# Altium footprint library LED.PcbLib: 71 footprints (part 3 of 5)
Each footprint in its own frame and in the unit in brackets; x right, y up, seen from the top. Pads: shape width x height; smd on the part's side, far side on the other; paste and mask are expansions set on the pad; w line width, h text height; cw(c..) or ccw(c..) is an arc to the next point about the centre after c.
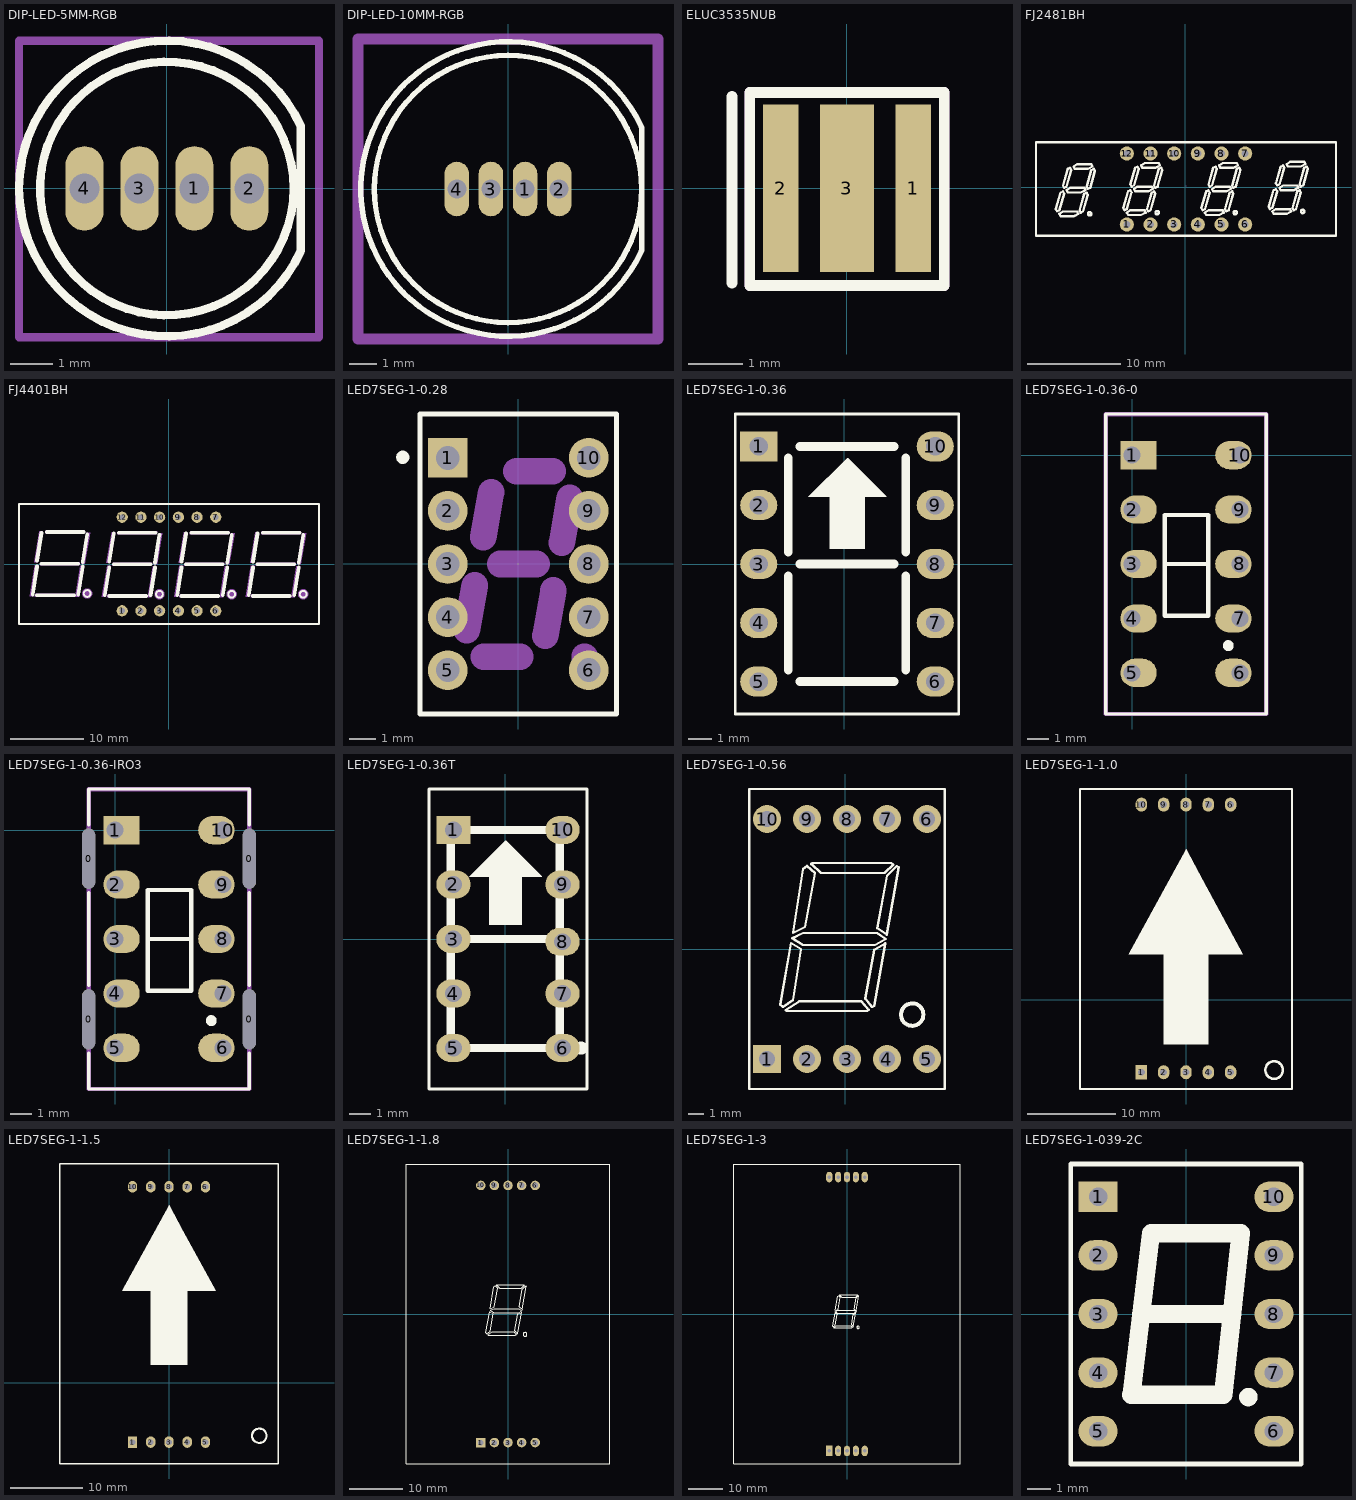
[diagram p2: the footprints below, top view; thin cyan lines are the x and y axes]

## DIP-LED-5MM-RGB [mm]
pads (4):
  oval 0.9x2 hole 0.7: 1(0.65,0) 2(1.95,0) 3(-0.65,0) 4(-1.95,0)
Top Overlay:
  circle w0.2: c0,0 r3
  lines w0.2: 3.172,-1.479 cw(c0,0) 3.172,1.479 3.172,-1.479
Mechanical 13:
  lines w0.2: -3.5,-3.525 -3.5,3.5 3.6,3.5 3.6,-3.525 -3.5,-3.525
  text ".Designator" at -2.525,-0.675 h2
Mechanical 15:
  lines w0.2: -3.5,-3.525 3.6,-3.525 3.6,3.5 -3.5,3.5 -3.5,-3.525
  text ".Comment" at -2.525,-0.675 h2
3D body "User Library-LED_5MM_RGB v4.step": height 7.99, standoff -6.7, extent -3,-3 2.6,3

## DIP-LED-10MM-RGB [mm]
pads (4):
  oval 0.9x2 hole 0.7: 1(0.625,0) 2(1.875,0) 3(-0.625,0) 4(-1.875,0)
Top Overlay:
  circle w0.2: c0,0 r4.9
  lines w0.2: 4.894,-2.282 cw(c0,0) 4.894,2.282 ; 4.9,-2.25 4.9,2.25 4.9,0
Mechanical 13:
  lines w0.4: -5.5,-5.5 -5.5,5.5 5.5,5.5 5.5,-5.5 -5.5,-5.5
  text ".Designator" at -5.5,-0.75 h3
Mechanical 15:
  lines w0.4: -5.5,-5.5 5.5,-5.5 5.5,5.5 -5.5,5.5 -5.5,-5.5
  text ".Comment" at -5.5,-0.75 h3
3D body "User Library-LED_RGB_10mm_1_27_long.STEP": height 11, standoff -29.5, extent -6,-5.996 5,5.996

## ELUC3535NUB [mm]
pads (3):
  rect 0.65x3.1 smd: 1(1.225,0) 2(-1.225,0)
  rect 1x3.1 smd: 3(0,0)
Top Overlay:
  lines w0.2: -2.125,-1.75 -2.125,1.7 ; -1.8,-1.8 1.8,-1.8 1.8,1.775 -1.8,1.775 -1.8,-1.8
Mechanical 13:
  lines w0.2: -1.8,-1.8 1.8,-1.8 1.8,1.775 -1.8,1.775 -1.8,-1.8
  text ".Designator" at -0.9,-0.233 h1
3D body: height 1.3, standoff 0, extent -1.7,-1.7 1.7,1.7

## FJ2481BH [mil]
pads (12):
  round 60 hole 30 paste+0 mask+2: 1(-246.14,-158.15) 2(-146.14,-158.15) 3(-46.14,-158.15) 4(53.86,-158.15) 5(153.86,-158.15) 6(253.86,-158.15) 7(253.86,141.85) 8(153.86,141.85) 9(53.86,141.85) 10(-46.14,141.85) 11(-146.14,141.85) 12(-246.14,141.85)
Top Overlay:
  drawing of 196 lines, arcs and shapes, not listed
Mechanical 15:
  lines w0.1: 3.85,4.67 3.87,4.68
3D body "7 segment display 7mm grn.stp": height 316.34, standoff -37.99, extent 315.32,-206.96 622.4,190.67
3D body "7 segment display 7mm grn.stp": height 316.34, standoff -37.99, extent 5.49,-206.96 312.57,190.67
3D body "7 segment display 7mm grn.stp": height 316.34, standoff -37.99, extent -304.34,-206.96 2.74,190.67
3D body "7 segment display 7mm grn.stp": height 316.34, standoff -37.99, extent -614.17,-206.96 -307.09,190.67

## FJ4401BH [mil]
pads (12):
  round 60 hole 30 paste+0 mask+2: 1(-250,-250) 2(-150,-250) 3(-50,-250) 4(50,-250) 5(150,-250) 6(250,-250) 7(250,250) 8(150,250) 9(50,250) 10(-50,250) 11(-150,250) 12(-250,250)
Top Overlay:
  circle w10: c716.54,-161.42 r18.15
  circle w10: c334.65,-161.42 r18.15
  circle w10: c-51.18,-161.42 r18.15
  circle w10: c-437.01,-157.48 r18.15
  lines w10: -801.18,-320.87 -801.18,320.87 -250,320.87 250,320.87 801.18,320.87 801.18,-320.87 250,-320.87 -250,-320.87 -801.18,-320.87
  lines w19.68: -728.35,-163.38 -704.72,-13.78 ; -704.73,-167.33 -507.83,-167.33 ; -704.72,17.72 -681.1,167.32 ; -681.13,1.97 -484.23,1.97 ; -653.54,171.26 -456.69,171.26 ; -484.25,-163.38 -460.63,-13.78 ; -460.63,9.84 -437.01,159.45 ; -342.52,-167.32 -318.9,-17.71 ; -318.9,-171.27 -122,-171.27 ; -318.9,13.78 -295.28,163.39 ; -295.3,-1.97 -98.4,-1.97 ; -267.72,167.33 -70.87,167.33 ; -98.43,-167.32 -74.8,-17.71 ; -74.8,5.91 -51.18,155.51 ; 43.31,-167.32 66.93,-17.71 ; 66.93,-171.27 263.83,-171.27 ; 66.93,13.78 90.55,163.39 ; 90.53,-1.97 287.43,-1.97 ; 118.11,167.33 314.96,167.33 ; 287.4,-167.32 311.03,-17.71 ; 311.03,5.91 334.64,155.51 ; 425.2,-167.32 448.82,-17.71 ; 448.82,-171.27 645.72,-171.27 ; 448.82,13.78 472.44,163.39 ; 472.42,-1.97 669.32,-1.97 ; 500,167.33 696.85,167.33 ; 669.29,-167.32 692.92,-17.71 ; 692.92,5.91 716.54,155.51
Mechanical 15:
  circle w27.56: c-51.18,-161.42 r13.78
  circle w27.56: c-437.01,-157.48 r13.78
  circle w27.56: c716.54,-161.42 r13.78
  circle w27.56: c334.65,-161.42 r13.78
  region: 496.06,175.2 704.73,175.2 700.79,159.45 492.13,159.45
  region: 468.51,5.91 677.17,5.91 673.23,-9.84 464.57,-9.84
  region: 439.51,-162.16 648.17,-162.16 644.23,-177.91 435.57,-177.91
  region: 460.83,170.83 480.51,170.83 452.95,5.47 433.27,5.47
  region: 437.29,-9.77 456.97,-9.77 429.41,-175.12 409.73,-175.12
  region: 712.6,163.39 732.28,163.39 704.73,-1.97 685.04,-1.97
  region: 680.83,-13.33 700.51,-13.33 672.95,-178.68 653.27,-178.68
  region: 114.17,175.2 322.84,175.2 318.9,159.45 110.24,159.45
  region: 86.61,5.91 295.28,5.91 291.34,-9.84 82.68,-9.84
  region: 57.62,-162.16 266.28,-162.16 262.34,-177.91 53.68,-177.91
  region: 78.94,170.83 98.62,170.83 71.06,5.47 51.38,5.47
  region: 55.39,-9.77 75.08,-9.77 47.52,-175.12 27.84,-175.12
  region: 330.71,163.39 350.39,163.39 322.84,-1.97 303.15,-1.97
  region: 298.94,-13.33 318.62,-13.33 291.06,-178.68 271.38,-178.68
  region: -271.65,175.2 -62.99,175.2 -66.93,159.45 -275.59,159.45
  region: -299.21,5.91 -90.55,5.91 -94.49,-9.84 -303.15,-9.84
  region: -328.21,-162.16 -119.55,-162.16 -123.49,-177.91 -332.15,-177.91
  region: -306.89,170.83 -287.21,170.83 -314.76,5.47 -334.45,5.47
  region: -330.43,-9.77 -310.75,-9.77 -338.31,-175.12 -357.99,-175.12
  region: -55.12,163.39 -35.43,163.39 -62.99,-1.97 -82.68,-1.97
  region: -86.89,-13.33 -67.21,-13.33 -94.77,-178.68 -114.45,-178.68
  region: -657.48,179.14 -448.82,179.14 -452.76,163.39 -661.42,163.39
  region: -685.04,9.84 -476.38,9.84 -480.32,-5.9 -688.98,-5.9
  region: -714.04,-158.22 -505.38,-158.22 -509.32,-173.97 -717.98,-173.97
  region: -692.72,174.76 -673.03,174.76 -700.59,9.41 -720.28,9.41
  region: -716.26,-5.83 -696.57,-5.83 -724.13,-171.19 -743.82,-171.19
  region: -440.95,167.32 -421.26,167.32 -448.82,1.97 -468.5,1.97
  region: -472.72,-9.39 -453.03,-9.39 -480.59,-174.75 -500.28,-174.75
3D body "end-el-san Co Ltd-King Bright CA04-41.step": height 276.77, standoff -156.3, extent -793.31,-312.99 797.24,316.93

## LED7SEG-1-0.28 [mm]
height 7.62
pads (10):
  rect 1.5x1.5 hole 0.9: 1(-2.655,4)
  round 1.5 hole 0.9: 2(-2.655,2) 3(-2.655,0) 4(-2.655,-2) 5(-2.655,-4) 6(2.655,-4) 7(2.655,-2) 8(2.655,0) 9(2.655,2) 10(2.655,4)
Top Overlay:
  circle w0.25: c-4.35,4.02 r0.125
  lines w0.2: -3.7,-5.65 3.7,-5.65 3.7,5.65 -0.635,5.65 -3.7,5.65 -3.7,-5.65
Mechanical 1:
  circle w0.75: c2.5,-3.5 r0.13
  lines w1: -1.939,-2.497 -1.642,-0.801 ; -1.322,1.002 -1.024,2.699 ; -1.302,-3.5 0.066,-3.5 ; -0.685,0 0.686,0 ; -0.067,3.5 1.303,3.5 ; 1.024,-2.699 1.324,-0.999 ; 1.641,0.802 1.938,2.5
3D body "7 segment display 7mm grn.stp": height 8.04, standoff -0.96, extent -3.9,-5.05 3.9,5.05

## LED7SEG-1-0.36 [mil]
height 300
pads (10):
  rect 62.99x51.18 hole 31: 1(-145,200)
  oval 62.99x51.18 hole 31: 2(-145,100) 3(-145,0) 4(-145,-100) 5(-145,-200) 6(155,-200) 7(155,-100) 8(155,0) 9(155,100) 10(155,200)
Top Overlay:
  circle w12: c144,-200 r6
  region: -61,114 5,180 7,180 72,115 72,114 35,114 35,26 -24,26 -24,114
  lines w5: -185,-255 -185,255 195,255 195,-255 -185,-255
  lines w15: -95,-180 -95,-20 ; -95,-180 -95,-20 ; -95,-180 -95,-20 ; -95,-180 -95,-20 ; -95,-180 -95,-20 ; -95,-180 -95,-20 ; -95,-180 -95,-20 ; -95,-180 -95,-20 ; -95,20 -95,180 ; -95,20 -95,180 ; -95,20 -95,180 ; -95,20 -95,180 ; -95,20 -95,180 ; -95,20 -95,180 ; -95,20 -95,180 ; -95,20 -95,180 ; -75,-200 85,-200 ; -75,-200 85,-200 ; -75,-200 85,-200 ; -75,-200 85,-200 ; -75,0 85,0 ; -75,0 85,0 ; -75,0 85,0 ; -75,0 85,0 ; -75,0 85,0 ; -75,0 85,0 ; -75,0 85,0 ; -75,0 85,0 ; -75,200 85,200 ; -75,200 85,200 ; -75,200 85,200 ; -75,200 85,200 ; 105,-180 105,-20 ; 105,-180 105,-20 ; 105,-180 105,-20 ; 105,-180 105,-20 ; 105,-180 105,-20 ; 105,-180 105,-20 ; 105,-180 105,-20 ; 105,-180 105,-20 ; 105,20 105,180 ; 105,20 105,180 ; 105,20 105,180 ; 105,20 105,180 ; 105,20 105,180 ; 105,20 105,180 ; 105,20 105,180 ; 105,20 105,180
3D body "27755.stp": height 275.59, standoff -118.11, extent -183.97,-255.9 193.98,255.91

## LED7SEG-1-0.36-0 [mm] "led 7 - 0.36 - 10 pin"
height 8
pads (10):
  rect 1.7x1.32 hole 0.8 copper offset 0.3,0: 1(0,0)
  oval 1.7x1.32 hole 0.8 copper offset 0.3,0: 2(0,-2.54) 3(0,-5.08) 4(0,-7.62) 5(0,-10.16)
  oval 1.7x1.32 hole 0.8 copper offset -0.3,0: 6(5.03,-10.16) 7(5.03,-7.62) 8(5.03,-5.08) 9(5.03,-2.54) 10(5.03,0)
Top Overlay:
  circle w0.254: c4.487,-8.89 r0.127
  lines w0.15: -1.235,-12.08 -1.235,-10.414 -1.235,0.254 -1.235,1.92 6.265,1.92 ; -1.235,-12.08 -1.235,-12.08 ; -1.235,-12.08 6.265,-12.08 6.265,-10.414 6.265,0.254 6.265,1.92 ; 6.265,1.92 6.265,1.92
  lines w0.2: 1.524,-5.08 3.556,-5.08 ; 1.524,-7.493 3.556,-7.493 3.556,-2.794 1.524,-2.794 1.524,-7.493
Mechanical 13:
  lines w0.2: -1.235,-12.08 6.265,-12.08 6.265,1.904 -1.235,1.904 -1.235,-12.08
  text ".Designator" at 3.178,-9.693 h2
3D body "SW3dPS-Disp_SA36-11.STEP": height 8.53, standoff -3.97, extent -1.235,-12.08 6.265,1.92

## LED7SEG-1-0.36-IRO3 [mm] "led 7 - 0.36 - 10 pin"
height 8
pads (14):
  oval 0.6x2.8 hole 0.6 slot 2.8 at 90 deg unplated: 0(-1.235,-8.83) 0(-1.235,-1.33) 0(6.265,-8.83) 0(6.265,-1.33)
  rect 1.7x1.32 hole 0.8 copper offset 0.3,0: 1(0,0)
  oval 1.7x1.32 hole 0.8 copper offset 0.3,0: 2(0,-2.54) 3(0,-5.08) 4(0,-7.62) 5(0,-10.16)
  oval 1.7x1.32 hole 0.8 copper offset -0.3,0: 6(5.03,-10.16) 7(5.03,-7.62) 8(5.03,-5.08) 9(5.03,-2.54) 10(5.03,0)
Top Overlay:
  circle w0.254: c4.487,-8.89 r0.127
  lines w0.15: -1.235,-10.414 -1.235,-12.08 ; -1.235,-7.239 -1.235,-2.921 ; -1.235,0.254 -1.235,1.92 6.265,1.92 ; 6.265,-10.414 6.265,-12.08 -1.235,-12.08 ; 6.265,-7.239 6.265,-2.921 ; 6.265,0.254 6.265,1.92 ; -1.235,-12.08 -1.235,-12.08 ; 6.265,1.92 6.265,1.92
  lines w0.2: 1.524,-5.08 3.556,-5.08 ; 1.524,-7.493 3.556,-7.493 3.556,-2.794 1.524,-2.794 1.524,-7.493
Mechanical 13:
  lines w0.2: -1.235,-12.08 6.265,-12.08 6.265,1.904 -1.235,1.904 -1.235,-12.08
  text ".Designator" at 0.375,-5.722 h2
3D body "SW3dPS-Disp_SA36-11.STEP": height 7.58, standoff -4.92, extent -1.235,-12.08 6.265,1.92

## LED7SEG-1-0.36T [mil] "LED, 7-Segment Display, 7.62 mm, RHD; 10 Leads; Row Space 5.08 mm; Pitch 2.54 mm"
height 300
pads (10):
  rect 62.99x51.18 hole 31: 1(-95,200)
  oval 62.99x51.18 hole 31: 2(-95,100) 3(-95,0) 4(-95,-100) 5(-95,-200) 6(105,-200) 7(105,-100) 8(105,-5) 9(105,100) 10(105,200)
Top Overlay:
  circle w12: c139,-200 r6
  region: -66,114 0,180 2,180 67,115 67,114 30,114 30,26 -29,26 -29,114
  lines w5: -140,-275 150,-275 150,275 -140,275 -140,-275
  lines w15: -100,-180 -100,-20 ; -100,-180 -100,-20 ; -100,-180 -100,-20 ; -100,-180 -100,-20 ; -100,-180 -100,-20 ; -100,-180 -100,-20 ; -100,-180 -100,-20 ; -100,-180 -100,-20 ; -100,20 -100,180 ; -100,20 -100,180 ; -100,20 -100,180 ; -100,20 -100,180 ; -100,20 -100,180 ; -100,20 -100,180 ; -100,20 -100,180 ; -100,20 -100,180 ; -80,-200 80,-200 ; -80,-200 80,-200 ; -80,-200 80,-200 ; -80,-200 80,-200 ; -80,0 80,0 ; -80,0 80,0 ; -80,0 80,0 ; -80,0 80,0 ; -80,0 80,0 ; -80,0 80,0 ; -80,0 80,0 ; -80,0 80,0 ; -80,200 80,200 ; -80,200 80,200 ; -80,200 80,200 ; -80,200 80,200 ; 100,-180 100,-20 ; 100,-180 100,-20 ; 100,-180 100,-20 ; 100,-180 100,-20 ; 100,-180 100,-20 ; 100,-180 100,-20 ; 100,-180 100,-20 ; 100,-180 100,-20 ; 100,20 100,180 ; 100,20 100,180 ; 100,20 100,180 ; 100,20 100,180 ; 100,20 100,180 ; 100,20 100,180 ; 100,20 100,180 ; 100,20 100,180
3D body "SW3dPS-Disp_SA36-11.STEP": height 156.19, standoff -335.93, extent -142.64,-275.59 152.63,275.59

## LED7SEG-1-0.56 [mil]
pads (10):
  rect 70x70 hole 40: 1(-195,-275)
  round 70 hole 40: 2(-95,-275) 3(5,-275) 4(105,-275) 5(205,-275) 6(205,325) 7(105,325) 8(5,325) 9(-95,325) 10(-195,325)
Top Overlay:
  circle w10: c168,-164 r28.02
  lines w6: -140,-155 -119,-155 ; -116,-155 -143,-155 -145,-155 ; -74,215 102,215 115,215 121,211 99,190 78,190 ; -72,215 -82,215 -85,213 -84,212 -60,190 80,190 ; -155,-145 -130,-128 ; -155,-145 -162,-139 -135,15 -110,0 -130,-128 ; -155,-145 -130,-128 ; -145,-155 -95,-155 55,-155 59,-152 41,-131 -114,-131 -148,-153 -145,-155 ; -239,-350 249,-350 249,400 -239,400 -239,-350 ; -132,27 -105,40 80,40 102,25 75,10 -105,10 -132,27 ; -130,40 -100,55 -75,190 -95,208 -105,200 -130,40 ; 51,-124 73,-2 77,0 101,14 73,-142 68,-145 51,-124 ; 81,52 105,183 129,207 134,205 104,36 81,52
3D body "27763.stp": height 314.96, standoff -137.8, extent -241.06,-349.01 251.07,399.02

## LED7SEG-1-1.0 [mm]
height 7.62
pads (10):
  rect 1.3x1.6 hole 0.787: 1(-5.08,-8.255)
  oval 1.3x1.6 hole 0.787: 2(-2.54,-8.255) 3(0,-8.255) 4(2.54,-8.255) 5(5.08,-8.255) 6(5.08,22.225) 7(2.54,22.225) 8(0,22.225) 9(-2.54,22.225) 10(-5.08,22.225)
Top Overlay:
  circle w0.305: c10.033,-8.001 r1
  region: -6.502,5.182 0,17.145 1.905,13.589 6.477,5.182 2.54,5.182 2.54,-5.08 -2.54,-5.08 -2.54,5.182
  lines w0.2: -12.065,-10.16 12.065,-10.16 12.065,24.003 -12.065,24.003 -12.065,-10.16
3D body "7seg1inch.SLDPRT": height 10.5, standoff -3, extent -12,-10.033 12,23.967

## LED7SEG-1-1.5 [mm]
height 7.62
pads (10):
  rect 1.3x1.6 hole 0.787: 1(-5.08,-8.255)
  oval 1.3x1.6 hole 0.787: 2(-2.54,-8.255) 3(0,-8.255) 4(2.54,-8.255) 5(5.08,-8.255) 6(5.08,27.305) 7(2.54,27.305) 8(0,27.305) 9(-2.54,27.305) 10(-5.08,27.305)
Top Overlay:
  circle w0.305: c12.573,-7.366 r1
  region: -6.502,12.802 0,24.765 1.905,21.209 6.477,12.802 2.54,12.802 2.54,2.54 -2.54,2.54 -2.54,12.802
  lines w0.178: 8.255,-11.303 15.24,-11.303 15.24,-8.255 15.24,30.48 0,30.48 -15.24,30.48 -15.24,-7.874 -15.24,-11.303 2.54,-11.303 9.525,-11.303

## LED7SEG-1-1.8 [mil]
pads (10):
  rect 70x70 hole 40: 1(-200,-944.88)
  round 70 hole 40: 2(-100,-944.88) 3(0,-944.88) 4(100,-944.88) 5(200,-944.88) 6(200,944.88) 7(100,944.88) 8(0,944.88) 9(-100,944.88) 10(-200,944.88)
Top Overlay:
  circle w5: c125,-150 r14.14
  lines w5: -748.03,-1102.36 -748.03,1102.36 748.03,1102.36 748.03,-1102.36 -748.03,-1102.36
  lines w6: -140,-155 -119,-155 ; -116,-155 -143,-155 -145,-155 ; -74,215 102,215 115,215 121,211 99,190 78,190 ; -72,215 -82,215 -85,213 -84,212 -60,190 80,190 ; -155,-145 -130,-128 ; -155,-145 -162,-139 -135,15 -110,0 -130,-128 ; -155,-145 -130,-128 ; -145,-155 -148,-153 -114,-131 41,-131 59,-152 55,-155 -95,-155 -145,-155 ; -132,27 -105,10 75,10 102,25 80,40 -105,40 -132,27 ; -130,40 -105,200 -95,208 -75,190 -100,55 -130,40 ; 51,-124 68,-145 73,-142 101,14 77,0 73,-2 51,-124 ; 81,52 104,36 134,205 129,207 105,183 81,52
3D body: height 433.07, standoff 0, extent -750,-1105 750,1105

## LED7SEG-1-3 [mil]
pads (10):
  rect 70x118.11 hole 40: 1(-200,-1544.28)
  oval 70x118.11 hole 40: 2(-100,-1544.28) 3(0,-1544.28) 4(100,-1544.28) 5(200,-1544.28) 6(200,1546.28) 7(100,1546.28) 8(0,1546.28) 9(-100,1546.28) 10(-200,1546.28)
Top Overlay:
  circle w5: c125,-149 r14.14
  lines w5: -1279.53,-1691.91 1279.53,-1691.91 1279.53,1693.91 -1279.53,1693.91 -1279.53,-1691.91
  lines w6: -140,-154 -119,-154 ; -116,-154 -143,-154 -145,-154 ; -74,216 102,216 115,216 121,212 99,191 78,191 ; -72,216 -82,216 -85,214 -84,213 -60,191 80,191 ; -155,-144 -130,-127 ; -155,-144 -162,-138 -135,16 -110,1 -130,-127 ; -155,-144 -130,-127 ; -145,-154 -95,-154 55,-154 59,-151 41,-130 -114,-130 -148,-152 -145,-154 ; -132,28 -105,41 80,41 102,26 75,11 -105,11 -132,28 ; -130,41 -100,56 -75,191 -95,209 -105,201 -130,41 ; 51,-123 73,-1 77,1 101,15 73,-141 68,-144 51,-123 ; 81,53 105,184 129,208 134,206 104,37 81,53
3D body: height 472.44, standoff 0, extent -1280,-1694 1280,1696

## LED7SEG-1-039-2C [mm] "led 7 - 0.36 - 10 pin"
height 8
pads (10):
  rect 1.7x1.32 hole 0.8: 1(-3.81,5.08)
  oval 1.7x1.32 hole 0.8: 2(-3.81,2.54) 3(-3.81,0) 4(-3.81,-2.54) 5(-3.81,-5.08) 6(3.81,-5.08) 7(3.81,-2.54) 8(3.81,0) 9(3.81,2.54) 10(3.81,5.08)
Top Overlay:
  circle w0.4: c2.7,-3.6 r0.2
  lines w0.2: -5,-6.5 5,-6.5 5,6.5 -5,6.5 -5,-6.5
  lines w0.8: -1.94,0 2,0 ; -2.365,-3.5 1.621,-3.5 2.379,3.5 -1.514,3.5 -2.365,-3.5
3D body: height 7.01, standoff 7, extent 3.518,-4.7 4.089,-4.2
3D body: height 7.01, standoff 7, extent -3.135,-5.1 3,4.42
3D body: height 7, standoff 0, extent -5,-6.5 5,6.5